# Altium footprint library ref-packages.PCBLIB: 1543 footprints (part 81 of 103)
Each footprint in its own frame and in the unit in brackets; x right, y up, seen from the top. Pads: shape width x height; smd on the part's side, far side on the other; paste and mask are expansions set on the pad; w line width, h text height; cw(c..) or ccw(c..) is an arc to the next point about the centre after c.
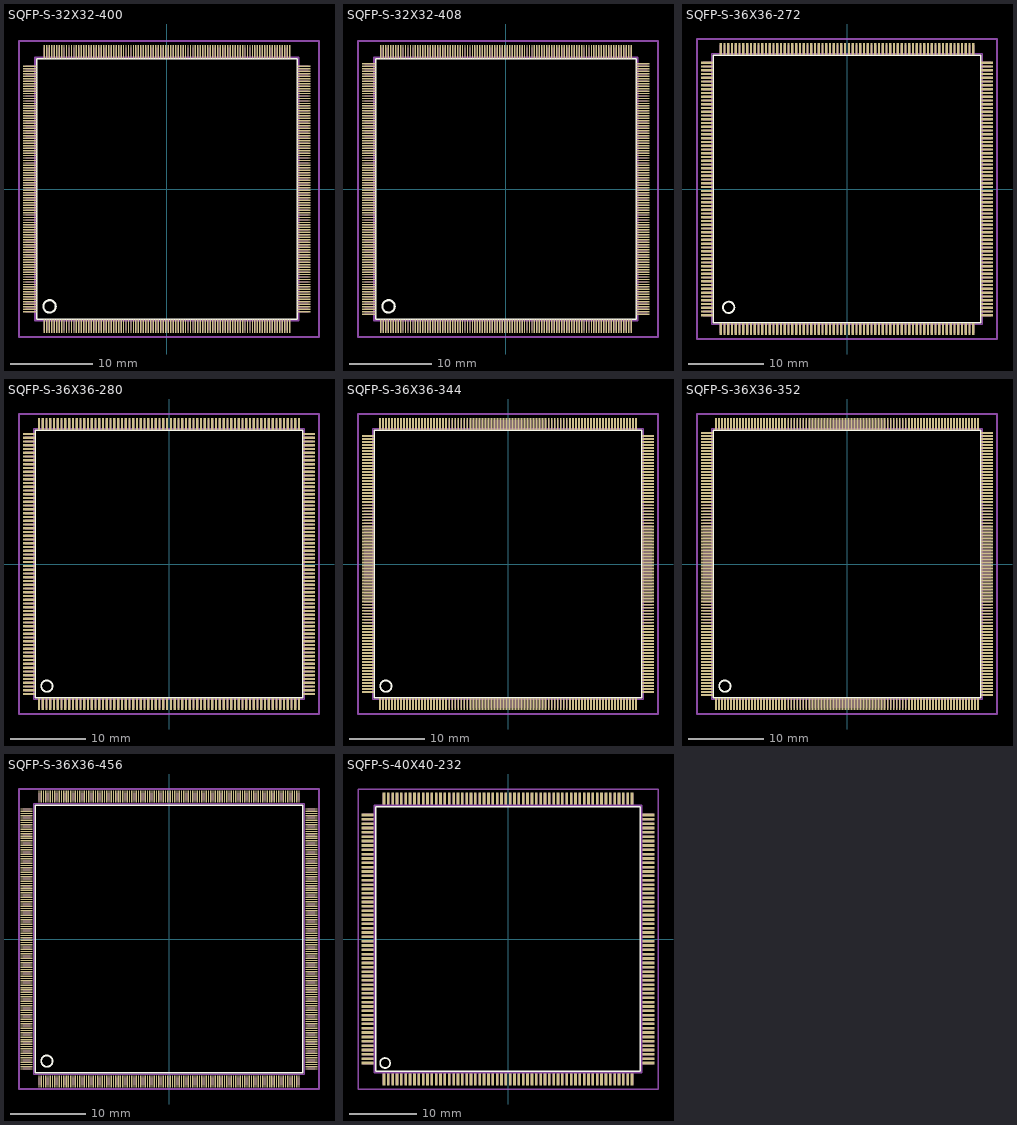
[diagram p80: the footprints below, top view; thin cyan lines are the x and y axes]

## SQFP-S-32X32-400 [mm]
pads (400):
  rect 0.17x1.6 smd: 1(-14.85,-16.6) 2(-14.55,-16.6) 3(-14.25,-16.6) 4(-13.95,-16.6) 5(-13.65,-16.6) 6(-13.35,-16.6) 7(-13.05,-16.6) 8(-12.75,-16.6) 9(-12.45,-16.6) 10(-12.15,-16.6) 11(-11.85,-16.6) 12(-11.55,-16.6) 13(-11.25,-16.6) 14(-10.95,-16.6) 15(-10.65,-16.6) 16(-10.35,-16.6) 17(-10.05,-16.6) 18(-9.75,-16.6) 19(-9.45,-16.6) 20(-9.15,-16.6) 21(-8.85,-16.6) 22(-8.55,-16.6) 23(-8.25,-16.6) 24(-7.95,-16.6) 25(-7.65,-16.6) 26(-7.35,-16.6) 27(-7.05,-16.6) 28(-6.75,-16.6) 29(-6.45,-16.6) 30(-6.15,-16.6) 31(-5.85,-16.6) 32(-5.55,-16.6) 33(-5.25,-16.6) 34(-4.95,-16.6) 35(-4.65,-16.6) 36(-4.35,-16.6) 37(-4.05,-16.6) 38(-3.75,-16.6) 39(-3.45,-16.6) 40(-3.15,-16.6) 41(-2.85,-16.6) 42(-2.55,-16.6) 43(-2.25,-16.6) 44(-1.95,-16.6) 45(-1.65,-16.6) 46(-1.35,-16.6) 47(-1.05,-16.6) 48(-0.75,-16.6) 49(-0.45,-16.6) 50(-0.15,-16.6) 51(0.15,-16.6) 52(0.45,-16.6) 53(0.75,-16.6) 54(1.05,-16.6) 55(1.35,-16.6) 56(1.65,-16.6) 57(1.95,-16.6) 58(2.25,-16.6) 59(2.55,-16.6) 60(2.85,-16.6) 61(3.15,-16.6) 62(3.45,-16.6) 63(3.75,-16.6) 64(4.05,-16.6) 65(4.35,-16.6) 66(4.65,-16.6) 67(4.95,-16.6) 68(5.25,-16.6) 69(5.55,-16.6) 70(5.85,-16.6) 71(6.15,-16.6) 72(6.45,-16.6) 73(6.75,-16.6) 74(7.05,-16.6) 75(7.35,-16.6) 76(7.65,-16.6) 77(7.95,-16.6) 78(8.25,-16.6) 79(8.55,-16.6) 80(8.85,-16.6) 81(9.15,-16.6) 82(9.45,-16.6) 83(9.75,-16.6) 84(10.05,-16.6) 85(10.35,-16.6) 86(10.65,-16.6) 87(10.95,-16.6) 88(11.25,-16.6) 89(11.55,-16.6) 90(11.85,-16.6) 91(12.15,-16.6) 92(12.45,-16.6) 93(12.75,-16.6) 94(13.05,-16.6) 95(13.35,-16.6) 96(13.65,-16.6) 97(13.95,-16.6) 98(14.25,-16.6) 99(14.55,-16.6) 100(14.85,-16.6) 201(14.85,16.6) 202(14.55,16.6) 203(14.25,16.6) 204(13.95,16.6) 205(13.65,16.6) 206(13.35,16.6) 207(13.05,16.6) 208(12.75,16.6) 209(12.45,16.6) 210(12.15,16.6) 211(11.85,16.6) 212(11.55,16.6) 213(11.25,16.6) 214(10.95,16.6) 215(10.65,16.6) 216(10.35,16.6) 217(10.05,16.6) 218(9.75,16.6) 219(9.45,16.6) 220(9.15,16.6) 221(8.85,16.6) 222(8.55,16.6) 223(8.25,16.6) 224(7.95,16.6) 225(7.65,16.6) 226(7.35,16.6) 227(7.05,16.6) 228(6.75,16.6) 229(6.45,16.6) 230(6.15,16.6) 231(5.85,16.6) 232(5.55,16.6) 233(5.25,16.6) 234(4.95,16.6) 235(4.65,16.6) 236(4.35,16.6) 237(4.05,16.6) 238(3.75,16.6) 239(3.45,16.6) 240(3.15,16.6) 241(2.85,16.6) 242(2.55,16.6) 243(2.25,16.6) 244(1.95,16.6) 245(1.65,16.6) 246(1.35,16.6) 247(1.05,16.6) 248(0.75,16.6) 249(0.45,16.6) 250(0.15,16.6) 251(-0.15,16.6) 252(-0.45,16.6) 253(-0.75,16.6) 254(-1.05,16.6) 255(-1.35,16.6) 256(-1.65,16.6) 257(-1.95,16.6) 258(-2.25,16.6) 259(-2.55,16.6) 260(-2.85,16.6) 261(-3.15,16.6) 262(-3.45,16.6) 263(-3.75,16.6) 264(-4.05,16.6) 265(-4.35,16.6) 266(-4.65,16.6) 267(-4.95,16.6) 268(-5.25,16.6) 269(-5.55,16.6) 270(-5.85,16.6) 271(-6.15,16.6) 272(-6.45,16.6) 273(-6.75,16.6) 274(-7.05,16.6) 275(-7.35,16.6) 276(-7.65,16.6) 277(-7.95,16.6) 278(-8.25,16.6) 279(-8.55,16.6) 280(-8.85,16.6) 281(-9.15,16.6) 282(-9.45,16.6) 283(-9.75,16.6) 284(-10.05,16.6) 285(-10.35,16.6) 286(-10.65,16.6) 287(-10.95,16.6) 288(-11.25,16.6) 289(-11.55,16.6) 290(-11.85,16.6) 291(-12.15,16.6) 292(-12.45,16.6) 293(-12.75,16.6) 294(-13.05,16.6) 295(-13.35,16.6) 296(-13.65,16.6) 297(-13.95,16.6) 298(-14.25,16.6) 299(-14.55,16.6) 300(-14.85,16.6)
  rect 1.6x0.17 smd: 101(16.6,-14.85) 102(16.6,-14.55) 103(16.6,-14.25) 104(16.6,-13.95) 105(16.6,-13.65) 106(16.6,-13.35) 107(16.6,-13.05) 108(16.6,-12.75) 109(16.6,-12.45) 110(16.6,-12.15) 111(16.6,-11.85) 112(16.6,-11.55) 113(16.6,-11.25) 114(16.6,-10.95) 115(16.6,-10.65) 116(16.6,-10.35) 117(16.6,-10.05) 118(16.6,-9.75) 119(16.6,-9.45) 120(16.6,-9.15) 121(16.6,-8.85) 122(16.6,-8.55) 123(16.6,-8.25) 124(16.6,-7.95) 125(16.6,-7.65) 126(16.6,-7.35) 127(16.6,-7.05) 128(16.6,-6.75) 129(16.6,-6.45) 130(16.6,-6.15) 131(16.6,-5.85) 132(16.6,-5.55) 133(16.6,-5.25) 134(16.6,-4.95) 135(16.6,-4.65) 136(16.6,-4.35) 137(16.6,-4.05) 138(16.6,-3.75) 139(16.6,-3.45) 140(16.6,-3.15) 141(16.6,-2.85) 142(16.6,-2.55) 143(16.6,-2.25) 144(16.6,-1.95) 145(16.6,-1.65) 146(16.6,-1.35) 147(16.6,-1.05) 148(16.6,-0.75) 149(16.6,-0.45) 150(16.6,-0.15) 151(16.6,0.15) 152(16.6,0.45) 153(16.6,0.75) 154(16.6,1.05) 155(16.6,1.35) 156(16.6,1.65) 157(16.6,1.95) 158(16.6,2.25) 159(16.6,2.55) 160(16.6,2.85) 161(16.6,3.15) 162(16.6,3.45) 163(16.6,3.75) 164(16.6,4.05) 165(16.6,4.35) 166(16.6,4.65) 167(16.6,4.95) 168(16.6,5.25) 169(16.6,5.55) 170(16.6,5.85) 171(16.6,6.15) 172(16.6,6.45) 173(16.6,6.75) 174(16.6,7.05) 175(16.6,7.35) 176(16.6,7.65) 177(16.6,7.95) 178(16.6,8.25) 179(16.6,8.55) 180(16.6,8.85) 181(16.6,9.15) 182(16.6,9.45) 183(16.6,9.75) 184(16.6,10.05) 185(16.6,10.35) 186(16.6,10.65) 187(16.6,10.95) 188(16.6,11.25) 189(16.6,11.55) 190(16.6,11.85) 191(16.6,12.15) 192(16.6,12.45) 193(16.6,12.75) 194(16.6,13.05) 195(16.6,13.35) 196(16.6,13.65) 197(16.6,13.95) 198(16.6,14.25) 199(16.6,14.55) 200(16.6,14.85) 301(-16.6,14.85) 302(-16.6,14.55) 303(-16.6,14.25) 304(-16.6,13.95) 305(-16.6,13.65) 306(-16.6,13.35) 307(-16.6,13.05) 308(-16.6,12.75) 309(-16.6,12.45) 310(-16.6,12.15) 311(-16.6,11.85) 312(-16.6,11.55) 313(-16.6,11.25) 314(-16.6,10.95) 315(-16.6,10.65) 316(-16.6,10.35) 317(-16.6,10.05) 318(-16.6,9.75) 319(-16.6,9.45) 320(-16.6,9.15) 321(-16.6,8.85) 322(-16.6,8.55) 323(-16.6,8.25) 324(-16.6,7.95) 325(-16.6,7.65) 326(-16.6,7.35) 327(-16.6,7.05) 328(-16.6,6.75) 329(-16.6,6.45) 330(-16.6,6.15) 331(-16.6,5.85) 332(-16.6,5.55) 333(-16.6,5.25) 334(-16.6,4.95) 335(-16.6,4.65) 336(-16.6,4.35) 337(-16.6,4.05) 338(-16.6,3.75) 339(-16.6,3.45) 340(-16.6,3.15) 341(-16.6,2.85) 342(-16.6,2.55) 343(-16.6,2.25) 344(-16.6,1.95) 345(-16.6,1.65) 346(-16.6,1.35) 347(-16.6,1.05) 348(-16.6,0.75) 349(-16.6,0.45) 350(-16.6,0.15) 351(-16.6,-0.15) 352(-16.6,-0.45) 353(-16.6,-0.75) 354(-16.6,-1.05) 355(-16.6,-1.35) 356(-16.6,-1.65) 357(-16.6,-1.95) 358(-16.6,-2.25) 359(-16.6,-2.55) 360(-16.6,-2.85) 361(-16.6,-3.15) 362(-16.6,-3.45) 363(-16.6,-3.75) 364(-16.6,-4.05) 365(-16.6,-4.35) 366(-16.6,-4.65) 367(-16.6,-4.95) 368(-16.6,-5.25) 369(-16.6,-5.55) 370(-16.6,-5.85) 371(-16.6,-6.15) 372(-16.6,-6.45) 373(-16.6,-6.75) 374(-16.6,-7.05) 375(-16.6,-7.35) 376(-16.6,-7.65) 377(-16.6,-7.95) 378(-16.6,-8.25) 379(-16.6,-8.55) 380(-16.6,-8.85) 381(-16.6,-9.15) 382(-16.6,-9.45) 383(-16.6,-9.75) 384(-16.6,-10.05) 385(-16.6,-10.35) 386(-16.6,-10.65) 387(-16.6,-10.95) 388(-16.6,-11.25) 389(-16.6,-11.55) 390(-16.6,-11.85) 391(-16.6,-12.15) 392(-16.6,-12.45) 393(-16.6,-12.75) 394(-16.6,-13.05) 395(-16.6,-13.35) 396(-16.6,-13.65) 397(-16.6,-13.95) 398(-16.6,-14.25) 399(-16.6,-14.55) 400(-16.6,-14.85)
Top Overlay:
  circle w0.254: c-14.2,-14.2 r0.75
  lines w0.203: -15.77,-15.76 15.76,-15.76 15.76,15.76 -15.77,15.76 -15.77,-15.76
Mechanical 16:
  drawing of 404 lines, arcs and shapes, not listed
Mechanical 27:
  lines w0.2: -17.9,-17.9 -17.9,17.9 18.4,17.9 18.4,-17.9 -17.9,-17.9

## SQFP-S-32X32-408 [mm]
pads (408):
  rect 0.17x1.6 smd: 1(-15.15,-16.6) 2(-14.85,-16.6) 3(-14.55,-16.6) 4(-14.25,-16.6) 5(-13.95,-16.6) 6(-13.65,-16.6) 7(-13.35,-16.6) 8(-13.05,-16.6) 9(-12.75,-16.6) 10(-12.45,-16.6) 11(-12.15,-16.6) 12(-11.85,-16.6) 13(-11.55,-16.6) 14(-11.25,-16.6) 15(-10.95,-16.6) 16(-10.65,-16.6) 17(-10.35,-16.6) 18(-10.05,-16.6) 19(-9.75,-16.6) 20(-9.45,-16.6) 21(-9.15,-16.6) 22(-8.85,-16.6) 23(-8.55,-16.6) 24(-8.25,-16.6) 25(-7.95,-16.6) 26(-7.65,-16.6) 27(-7.35,-16.6) 28(-7.05,-16.6) 29(-6.75,-16.6) 30(-6.45,-16.6) 31(-6.15,-16.6) 32(-5.85,-16.6) 33(-5.55,-16.6) 34(-5.25,-16.6) 35(-4.95,-16.6) 36(-4.65,-16.6) 37(-4.35,-16.6) 38(-4.05,-16.6) 39(-3.75,-16.6) 40(-3.45,-16.6) 41(-3.15,-16.6) 42(-2.85,-16.6) 43(-2.55,-16.6) 44(-2.25,-16.6) 45(-1.95,-16.6) 46(-1.65,-16.6) 47(-1.35,-16.6) 48(-1.05,-16.6) 49(-0.75,-16.6) 50(-0.45,-16.6) 51(-0.15,-16.6) 52(0.15,-16.6) 53(0.45,-16.6) 54(0.75,-16.6) 55(1.05,-16.6) 56(1.35,-16.6) 57(1.65,-16.6) 58(1.95,-16.6) 59(2.25,-16.6) 60(2.55,-16.6) 61(2.85,-16.6) 62(3.15,-16.6) 63(3.45,-16.6) 64(3.75,-16.6) 65(4.05,-16.6) 66(4.35,-16.6) 67(4.65,-16.6) 68(4.95,-16.6) 69(5.25,-16.6) 70(5.55,-16.6) 71(5.85,-16.6) 72(6.15,-16.6) 73(6.45,-16.6) 74(6.75,-16.6) 75(7.05,-16.6) 76(7.35,-16.6) 77(7.65,-16.6) 78(7.95,-16.6) 79(8.25,-16.6) 80(8.55,-16.6) 81(8.85,-16.6) 82(9.15,-16.6) 83(9.45,-16.6) 84(9.75,-16.6) 85(10.05,-16.6) 86(10.35,-16.6) 87(10.65,-16.6) 88(10.95,-16.6) 89(11.25,-16.6) 90(11.55,-16.6) 91(11.85,-16.6) 92(12.15,-16.6) 93(12.45,-16.6) 94(12.75,-16.6) 95(13.05,-16.6) 96(13.35,-16.6) 97(13.65,-16.6) 98(13.95,-16.6) 99(14.25,-16.6) 100(14.55,-16.6) 101(14.85,-16.6) 102(15.15,-16.6) 205(15.15,16.6) 206(14.85,16.6) 207(14.55,16.6) 208(14.25,16.6) 209(13.95,16.6) 210(13.65,16.6) 211(13.35,16.6) 212(13.05,16.6) 213(12.75,16.6) 214(12.45,16.6) 215(12.15,16.6) 216(11.85,16.6) 217(11.55,16.6) 218(11.25,16.6) 219(10.95,16.6) 220(10.65,16.6) 221(10.35,16.6) 222(10.05,16.6) 223(9.75,16.6) 224(9.45,16.6) 225(9.15,16.6) 226(8.85,16.6) 227(8.55,16.6) 228(8.25,16.6) 229(7.95,16.6) 230(7.65,16.6) 231(7.35,16.6) 232(7.05,16.6) 233(6.75,16.6) 234(6.45,16.6) 235(6.15,16.6) 236(5.85,16.6) 237(5.55,16.6) 238(5.25,16.6) 239(4.95,16.6) 240(4.65,16.6) 241(4.35,16.6) 242(4.05,16.6) 243(3.75,16.6) 244(3.45,16.6) 245(3.15,16.6) 246(2.85,16.6) 247(2.55,16.6) 248(2.25,16.6) 249(1.95,16.6) 250(1.65,16.6) 251(1.35,16.6) 252(1.05,16.6) 253(0.75,16.6) 254(0.45,16.6) 255(0.15,16.6) 256(-0.15,16.6) 257(-0.45,16.6) 258(-0.75,16.6) 259(-1.05,16.6) 260(-1.35,16.6) 261(-1.65,16.6) 262(-1.95,16.6) 263(-2.25,16.6) 264(-2.55,16.6) 265(-2.85,16.6) 266(-3.15,16.6) 267(-3.45,16.6) 268(-3.75,16.6) 269(-4.05,16.6) 270(-4.35,16.6) 271(-4.65,16.6) 272(-4.95,16.6) 273(-5.25,16.6) 274(-5.55,16.6) 275(-5.85,16.6) 276(-6.15,16.6) 277(-6.45,16.6) 278(-6.75,16.6) 279(-7.05,16.6) 280(-7.35,16.6) 281(-7.65,16.6) 282(-7.95,16.6) 283(-8.25,16.6) 284(-8.55,16.6) 285(-8.85,16.6) 286(-9.15,16.6) 287(-9.45,16.6) 288(-9.75,16.6) 289(-10.05,16.6) 290(-10.35,16.6) 291(-10.65,16.6) 292(-10.95,16.6) 293(-11.25,16.6) 294(-11.55,16.6) 295(-11.85,16.6) 296(-12.15,16.6) 297(-12.45,16.6) 298(-12.75,16.6) 299(-13.05,16.6) 300(-13.35,16.6) 301(-13.65,16.6) 302(-13.95,16.6) 303(-14.25,16.6) 304(-14.55,16.6) 305(-14.85,16.6) 306(-15.15,16.6)
  rect 1.6x0.17 smd: 103(16.6,-15.15) 104(16.6,-14.85) 105(16.6,-14.55) 106(16.6,-14.25) 107(16.6,-13.95) 108(16.6,-13.65) 109(16.6,-13.35) 110(16.6,-13.05) 111(16.6,-12.75) 112(16.6,-12.45) 113(16.6,-12.15) 114(16.6,-11.85) 115(16.6,-11.55) 116(16.6,-11.25) 117(16.6,-10.95) 118(16.6,-10.65) 119(16.6,-10.35) 120(16.6,-10.05) 121(16.6,-9.75) 122(16.6,-9.45) 123(16.6,-9.15) 124(16.6,-8.85) 125(16.6,-8.55) 126(16.6,-8.25) 127(16.6,-7.95) 128(16.6,-7.65) 129(16.6,-7.35) 130(16.6,-7.05) 131(16.6,-6.75) 132(16.6,-6.45) 133(16.6,-6.15) 134(16.6,-5.85) 135(16.6,-5.55) 136(16.6,-5.25) 137(16.6,-4.95) 138(16.6,-4.65) 139(16.6,-4.35) 140(16.6,-4.05) 141(16.6,-3.75) 142(16.6,-3.45) 143(16.6,-3.15) 144(16.6,-2.85) 145(16.6,-2.55) 146(16.6,-2.25) 147(16.6,-1.95) 148(16.6,-1.65) 149(16.6,-1.35) 150(16.6,-1.05) 151(16.6,-0.75) 152(16.6,-0.45) 153(16.6,-0.15) 154(16.6,0.15) 155(16.6,0.45) 156(16.6,0.75) 157(16.6,1.05) 158(16.6,1.35) 159(16.6,1.65) 160(16.6,1.95) 161(16.6,2.25) 162(16.6,2.55) 163(16.6,2.85) 164(16.6,3.15) 165(16.6,3.45) 166(16.6,3.75) 167(16.6,4.05) 168(16.6,4.35) 169(16.6,4.65) 170(16.6,4.95) 171(16.6,5.25) 172(16.6,5.55) 173(16.6,5.85) 174(16.6,6.15) 175(16.6,6.45) 176(16.6,6.75) 177(16.6,7.05) 178(16.6,7.35) 179(16.6,7.65) 180(16.6,7.95) 181(16.6,8.25) 182(16.6,8.55) 183(16.6,8.85) 184(16.6,9.15) 185(16.6,9.45) 186(16.6,9.75) 187(16.6,10.05) 188(16.6,10.35) 189(16.6,10.65) 190(16.6,10.95) 191(16.6,11.25) 192(16.6,11.55) 193(16.6,11.85) 194(16.6,12.15) 195(16.6,12.45) 196(16.6,12.75) 197(16.6,13.05) 198(16.6,13.35) 199(16.6,13.65) 200(16.6,13.95) 201(16.6,14.25) 202(16.6,14.55) 203(16.6,14.85) 204(16.6,15.15) 307(-16.6,15.15) 308(-16.6,14.85) 309(-16.6,14.55) 310(-16.6,14.25) 311(-16.6,13.95) 312(-16.6,13.65) 313(-16.6,13.35) 314(-16.6,13.05) 315(-16.6,12.75) 316(-16.6,12.45) 317(-16.6,12.15) 318(-16.6,11.85) 319(-16.6,11.55) 320(-16.6,11.25) 321(-16.6,10.95) 322(-16.6,10.65) 323(-16.6,10.35) 324(-16.6,10.05) 325(-16.6,9.75) 326(-16.6,9.45) 327(-16.6,9.15) 328(-16.6,8.85) 329(-16.6,8.55) 330(-16.6,8.25) 331(-16.6,7.95) 332(-16.6,7.65) 333(-16.6,7.35) 334(-16.6,7.05) 335(-16.6,6.75) 336(-16.6,6.45) 337(-16.6,6.15) 338(-16.6,5.85) 339(-16.6,5.55) 340(-16.6,5.25) 341(-16.6,4.95) 342(-16.6,4.65) 343(-16.6,4.35) 344(-16.6,4.05) 345(-16.6,3.75) 346(-16.6,3.45) 347(-16.6,3.15) 348(-16.6,2.85) 349(-16.6,2.55) 350(-16.6,2.25) 351(-16.6,1.95) 352(-16.6,1.65) 353(-16.6,1.35) 354(-16.6,1.05) 355(-16.6,0.75) 356(-16.6,0.45) 357(-16.6,0.15) 358(-16.6,-0.15) 359(-16.6,-0.45) 360(-16.6,-0.75) 361(-16.6,-1.05) 362(-16.6,-1.35) 363(-16.6,-1.65) 364(-16.6,-1.95) 365(-16.6,-2.25) 366(-16.6,-2.55) 367(-16.6,-2.85) 368(-16.6,-3.15) 369(-16.6,-3.45) 370(-16.6,-3.75) 371(-16.6,-4.05) 372(-16.6,-4.35) 373(-16.6,-4.65) 374(-16.6,-4.95) 375(-16.6,-5.25) 376(-16.6,-5.55) 377(-16.6,-5.85) 378(-16.6,-6.15) 379(-16.6,-6.45) 380(-16.6,-6.75) 381(-16.6,-7.05) 382(-16.6,-7.35) 383(-16.6,-7.65) 384(-16.6,-7.95) 385(-16.6,-8.25) 386(-16.6,-8.55) 387(-16.6,-8.85) 388(-16.6,-9.15) 389(-16.6,-9.45) 390(-16.6,-9.75) 391(-16.6,-10.05) 392(-16.6,-10.35) 393(-16.6,-10.65) 394(-16.6,-10.95) 395(-16.6,-11.25) 396(-16.6,-11.55) 397(-16.6,-11.85) 398(-16.6,-12.15) 399(-16.6,-12.45) 400(-16.6,-12.75) 401(-16.6,-13.05) 402(-16.6,-13.35) 403(-16.6,-13.65) 404(-16.6,-13.95) 405(-16.6,-14.25) 406(-16.6,-14.55) 407(-16.6,-14.85) 408(-16.6,-15.15)
Top Overlay:
  circle w0.254: c-14.2,-14.2 r0.75
  lines w0.203: -15.77,-15.76 15.76,-15.76 15.76,15.76 -15.77,15.76 -15.77,-15.76
Mechanical 16:
  drawing of 412 lines, arcs and shapes, not listed
Mechanical 27:
  lines w0.2: -17.9,-17.9 -17.9,17.9 18.4,17.9 18.4,-17.9 -17.9,-17.9

## SQFP-S-36X36-272 [mil]
pads (272):
  rect 11.81x62.99 smd: 1(-659.45,-732.28) 2(-639.76,-732.28) 3(-620.08,-732.28) 4(-600.39,-732.28) 5(-580.71,-732.28) 6(-561.02,-732.28) 7(-541.34,-732.28) 8(-521.65,-732.28) 9(-501.97,-732.28) 10(-482.28,-732.28) 11(-462.6,-732.28) 12(-442.91,-732.28) 13(-423.23,-732.28) 14(-403.54,-732.28) 15(-383.86,-732.28) 16(-364.17,-732.28) 17(-344.49,-732.28) 18(-324.8,-732.28) 19(-305.12,-732.28) 20(-285.43,-732.28) 21(-265.75,-732.28) 22(-246.06,-732.28) 23(-226.38,-732.28) 24(-206.69,-732.28) 25(-187.01,-732.28) 26(-167.32,-732.28) 27(-147.64,-732.28) 28(-127.95,-732.28) 29(-108.27,-732.28) 30(-88.58,-732.28) 31(-68.9,-732.28) 32(-49.21,-732.28) 33(-29.53,-732.28) 34(-9.84,-732.28) 35(9.84,-732.28) 36(29.53,-732.28) 37(49.21,-732.28) 38(68.9,-732.28) 39(88.58,-732.28) 40(108.27,-732.28) 41(127.95,-732.28) 42(147.64,-732.28) 43(167.32,-732.28) 44(187.01,-732.28) 45(206.69,-732.28) 46(226.38,-732.28) 47(246.06,-732.28) 48(265.75,-732.28) 49(285.43,-732.28) 50(305.12,-732.28) 51(324.8,-732.28) 52(344.49,-732.28) 53(364.17,-732.28) 54(383.86,-732.28) 55(403.54,-732.28) 56(423.23,-732.28) 57(442.91,-732.28) 58(462.6,-732.28) 59(482.28,-732.28) 60(501.97,-732.28) 61(521.65,-732.28) 62(541.34,-732.28) 63(561.02,-732.28) 64(580.71,-732.28) 65(600.39,-732.28) 66(620.08,-732.28) 67(639.76,-732.28) 68(659.45,-732.28) 137(659.45,732.28) 138(639.76,732.28) 139(620.08,732.28) 140(600.39,732.28) 141(580.71,732.28) 142(561.02,732.28) 143(541.34,732.28) 144(521.65,732.28) 145(501.97,732.28) 146(482.28,732.28) 147(462.6,732.28) 148(442.91,732.28) 149(423.23,732.28) 150(403.54,732.28) 151(383.86,732.28) 152(364.17,732.28) 153(344.49,732.28) 154(324.8,732.28) 155(305.12,732.28) 156(285.43,732.28) 157(265.75,732.28) 158(246.06,732.28) 159(226.38,732.28) 160(206.69,732.28) 161(187.01,732.28) 162(167.32,732.28) 163(147.64,732.28) 164(127.95,732.28) 165(108.27,732.28) 166(88.58,732.28) 167(68.9,732.28) 168(49.21,732.28) 169(29.53,732.28) 170(9.84,732.28) 171(-9.84,732.28) 172(-29.53,732.28) 173(-49.21,732.28) 174(-68.9,732.28) 175(-88.58,732.28) 176(-108.27,732.28) 177(-127.95,732.28) 178(-147.64,732.28) 179(-167.32,732.28) 180(-187.01,732.28) 181(-206.69,732.28) 182(-226.38,732.28) 183(-246.06,732.28) 184(-265.75,732.28) 185(-285.43,732.28) 186(-305.12,732.28) 187(-324.8,732.28) 188(-344.49,732.28) 189(-364.17,732.28) 190(-383.86,732.28) 191(-403.54,732.28) 192(-423.23,732.28) 193(-442.91,732.28) 194(-462.6,732.28) 195(-482.28,732.28) 196(-501.97,732.28) 197(-521.65,732.28) 198(-541.34,732.28) 199(-561.02,732.28) 200(-580.71,732.28) 201(-600.39,732.28) 202(-620.08,732.28) 203(-639.76,732.28) 204(-659.45,732.28)
  rect 62.99x11.81 smd: 69(732.28,-659.45) 70(732.28,-639.76) 71(732.28,-620.08) 72(732.28,-600.39) 73(732.28,-580.71) 74(732.28,-561.02) 75(732.28,-541.34) 76(732.28,-521.65) 77(732.28,-501.97) 78(732.28,-482.28) 79(732.28,-462.6) 80(732.28,-442.91) 81(732.28,-423.23) 82(732.28,-403.54) 83(732.28,-383.86) 84(732.28,-364.17) 85(732.28,-344.49) 86(732.28,-324.8) 87(732.28,-305.12) 88(732.28,-285.43) 89(732.28,-265.75) 90(732.28,-246.06) 91(732.28,-226.38) 92(732.28,-206.69) 93(732.28,-187.01) 94(732.28,-167.32) 95(732.28,-147.64) 96(732.28,-127.95) 97(732.28,-108.27) 98(732.28,-88.58) 99(732.28,-68.9) 100(732.28,-49.21) 101(732.28,-29.53) 102(732.28,-9.84) 103(732.28,9.84) 104(732.28,29.53) 105(732.28,49.21) 106(732.28,68.9) 107(732.28,88.58) 108(732.28,108.27) 109(732.28,127.95) 110(732.28,147.64) 111(732.28,167.32) 112(732.28,187.01) 113(732.28,206.69) 114(732.28,226.38) 115(732.28,246.06) 116(732.28,265.75) 117(732.28,285.43) 118(732.28,305.12) 119(732.28,324.8) 120(732.28,344.49) 121(732.28,364.17) 122(732.28,383.86) 123(732.28,403.54) 124(732.28,423.23) 125(732.28,442.91) 126(732.28,462.6) 127(732.28,482.28) 128(732.28,501.97) 129(732.28,521.65) 130(732.28,541.34) 131(732.28,561.02) 132(732.28,580.71) 133(732.28,600.39) 134(732.28,620.08) 135(732.28,639.76) 136(732.28,659.45) 205(-732.28,659.45) 206(-732.28,639.76) 207(-732.28,620.08) 208(-732.28,600.39) 209(-732.28,580.71) 210(-732.28,561.02) 211(-732.28,541.34) 212(-732.28,521.65) 213(-732.28,501.97) 214(-732.28,482.28) 215(-732.28,462.6) 216(-732.28,442.91) 217(-732.28,423.23) 218(-732.28,403.54) 219(-732.28,383.86) 220(-732.28,364.17) 221(-732.28,344.49) 222(-732.28,324.8) 223(-732.28,305.12) 224(-732.28,285.43) 225(-732.28,265.75) 226(-732.28,246.06) 227(-732.28,226.38) 228(-732.28,206.69) 229(-732.28,187.01) 230(-732.28,167.32) 231(-732.28,147.64) 232(-732.28,127.95) 233(-732.28,108.27) 234(-732.28,88.58) 235(-732.28,68.9) 236(-732.28,49.21) 237(-732.28,29.53) 238(-732.28,9.84) 239(-732.28,-9.84) 240(-732.28,-29.53) 241(-732.28,-49.21) 242(-732.28,-68.9) 243(-732.28,-88.58) 244(-732.28,-108.27) 245(-732.28,-127.95) 246(-732.28,-147.64) 247(-732.28,-167.32) 248(-732.28,-187.01) 249(-732.28,-206.69) 250(-732.28,-226.38) 251(-732.28,-246.06) 252(-732.28,-265.75) 253(-732.28,-285.43) 254(-732.28,-305.12) 255(-732.28,-324.8) 256(-732.28,-344.49) 257(-732.28,-364.17) 258(-732.28,-383.86) 259(-732.28,-403.54) 260(-732.28,-423.23) 261(-732.28,-442.91) 262(-732.28,-462.6) 263(-732.28,-482.28) 264(-732.28,-501.97) 265(-732.28,-521.65) 266(-732.28,-541.34) 267(-732.28,-561.02) 268(-732.28,-580.71) 269(-732.28,-600.39) 270(-732.28,-620.08) 271(-732.28,-639.76) 272(-732.28,-659.45)
Top Overlay:
  circle w10: c-618.11,-618.11 r29.53
  lines w8: -699.61,-699.21 699.21,-699.21 699.21,699.21 -699.61,699.21 -699.61,-699.21
Mechanical 16:
  drawing of 276 lines, arcs and shapes, not listed
Mechanical 27:
  lines w7.87: -783.46,-783.46 -783.46,783.46 783.46,783.46 783.46,-783.46 -783.46,-783.46

## SQFP-S-36X36-280 [mil]
pads (280):
  rect 11.81x62.99 smd: 1(-679.13,-732.28) 2(-659.45,-732.28) 3(-639.76,-732.28) 4(-620.08,-732.28) 5(-600.39,-732.28) 6(-580.71,-732.28) 7(-561.02,-732.28) 8(-541.34,-732.28) 9(-521.65,-732.28) 10(-501.97,-732.28) 11(-482.28,-732.28) 12(-462.6,-732.28) 13(-442.91,-732.28) 14(-423.23,-732.28) 15(-403.54,-732.28) 16(-383.86,-732.28) 17(-364.17,-732.28) 18(-344.49,-732.28) 19(-324.8,-732.28) 20(-305.12,-732.28) 21(-285.43,-732.28) 22(-265.75,-732.28) 23(-246.06,-732.28) 24(-226.38,-732.28) 25(-206.69,-732.28) 26(-187.01,-732.28) 27(-167.32,-732.28) 28(-147.64,-732.28) 29(-127.95,-732.28) 30(-108.27,-732.28) 31(-88.58,-732.28) 32(-68.9,-732.28) 33(-49.21,-732.28) 34(-29.53,-732.28) 35(-9.84,-732.28) 36(9.84,-732.28) 37(29.53,-732.28) 38(49.21,-732.28) 39(68.9,-732.28) 40(88.58,-732.28) 41(108.27,-732.28) 42(127.95,-732.28) 43(147.64,-732.28) 44(167.32,-732.28) 45(187.01,-732.28) 46(206.69,-732.28) 47(226.38,-732.28) 48(246.06,-732.28) 49(265.75,-732.28) 50(285.43,-732.28) 51(305.12,-732.28) 52(324.8,-732.28) 53(344.49,-732.28) 54(364.17,-732.28) 55(383.86,-732.28) 56(403.54,-732.28) 57(423.23,-732.28) 58(442.91,-732.28) 59(462.6,-732.28) 60(482.28,-732.28) 61(501.97,-732.28) 62(521.65,-732.28) 63(541.34,-732.28) 64(561.02,-732.28) 65(580.71,-732.28) 66(600.39,-732.28) 67(620.08,-732.28) 68(639.76,-732.28) 69(659.45,-732.28) 70(679.13,-732.28) 141(679.13,732.28) 142(659.45,732.28) 143(639.76,732.28) 144(620.08,732.28) 145(600.39,732.28) 146(580.71,732.28) 147(561.02,732.28) 148(541.34,732.28) 149(521.65,732.28) 150(501.97,732.28) 151(482.28,732.28) 152(462.6,732.28) 153(442.91,732.28) 154(423.23,732.28) 155(403.54,732.28) 156(383.86,732.28) 157(364.17,732.28) 158(344.49,732.28) 159(324.8,732.28) 160(305.12,732.28) 161(285.43,732.28) 162(265.75,732.28) 163(246.06,732.28) 164(226.38,732.28) 165(206.69,732.28) 166(187.01,732.28) 167(167.32,732.28) 168(147.64,732.28) 169(127.95,732.28) 170(108.27,732.28) 171(88.58,732.28) 172(68.9,732.28) 173(49.21,732.28) 174(29.53,732.28) 175(9.84,732.28) 176(-9.84,732.28) 177(-29.53,732.28) 178(-49.21,732.28) 179(-68.9,732.28) 180(-88.58,732.28) 181(-108.27,732.28) 182(-127.95,732.28) 183(-147.64,732.28) 184(-167.32,732.28) 185(-187.01,732.28) 186(-206.69,732.28) 187(-226.38,732.28) 188(-246.06,732.28) 189(-265.75,732.28) 190(-285.43,732.28) 191(-305.12,732.28) 192(-324.8,732.28) 193(-344.49,732.28) 194(-364.17,732.28) 195(-383.86,732.28) 196(-403.54,732.28) 197(-423.23,732.28) 198(-442.91,732.28) 199(-462.6,732.28) 200(-482.28,732.28) 201(-501.97,732.28) 202(-521.65,732.28) 203(-541.34,732.28) 204(-561.02,732.28) 205(-580.71,732.28) 206(-600.39,732.28) 207(-620.08,732.28) 208(-639.76,732.28) 209(-659.45,732.28) 210(-679.13,732.28)
  rect 62.99x11.81 smd: 71(732.28,-679.13) 72(732.28,-659.45) 73(732.28,-639.76) 74(732.28,-620.08) 75(732.28,-600.39) 76(732.28,-580.71) 77(732.28,-561.02) 78(732.28,-541.34) 79(732.28,-521.65) 80(732.28,-501.97) 81(732.28,-482.28) 82(732.28,-462.6) 83(732.28,-442.91) 84(732.28,-423.23) 85(732.28,-403.54) 86(732.28,-383.86) 87(732.28,-364.17) 88(732.28,-344.49) 89(732.28,-324.8) 90(732.28,-305.12) 91(732.28,-285.43) 92(732.28,-265.75) 93(732.28,-246.06) 94(732.28,-226.38) 95(732.28,-206.69) 96(732.28,-187.01) 97(732.28,-167.32) 98(732.28,-147.64) 99(732.28,-127.95) 100(732.28,-108.27) 101(732.28,-88.58) 102(732.28,-68.9) 103(732.28,-49.21) 104(732.28,-29.53) 105(732.28,-9.84) 106(732.28,9.84) 107(732.28,29.53) 108(732.28,49.21) 109(732.28,68.9) 110(732.28,88.58) 111(732.28,108.27) 112(732.28,127.95) 113(732.28,147.64) 114(732.28,167.32) 115(732.28,187.01) 116(732.28,206.69) 117(732.28,226.38) 118(732.28,246.06) 119(732.28,265.75) 120(732.28,285.43) 121(732.28,305.12) 122(732.28,324.8) 123(732.28,344.49) 124(732.28,364.17) 125(732.28,383.86) 126(732.28,403.54) 127(732.28,423.23) 128(732.28,442.91) 129(732.28,462.6) 130(732.28,482.28) 131(732.28,501.97) 132(732.28,521.65) 133(732.28,541.34) 134(732.28,561.02) 135(732.28,580.71) 136(732.28,600.39) 137(732.28,620.08) 138(732.28,639.76) 139(732.28,659.45) 140(732.28,679.13) 211(-732.28,679.13) 212(-732.28,659.45) 213(-732.28,639.76) 214(-732.28,620.08) 215(-732.28,600.39) 216(-732.28,580.71) 217(-732.28,561.02) 218(-732.28,541.34) 219(-732.28,521.65) 220(-732.28,501.97) 221(-732.28,482.28) 222(-732.28,462.6) 223(-732.28,442.91) 224(-732.28,423.23) 225(-732.28,403.54) 226(-732.28,383.86) 227(-732.28,364.17) 228(-732.28,344.49) 229(-732.28,324.8) 230(-732.28,305.12) 231(-732.28,285.43) 232(-732.28,265.75) 233(-732.28,246.06) 234(-732.28,226.38) 235(-732.28,206.69) 236(-732.28,187.01) 237(-732.28,167.32) 238(-732.28,147.64) 239(-732.28,127.95) 240(-732.28,108.27) 241(-732.28,88.58) 242(-732.28,68.9) 243(-732.28,49.21) 244(-732.28,29.53) 245(-732.28,9.84) 246(-732.28,-9.84) 247(-732.28,-29.53) 248(-732.28,-49.21) 249(-732.28,-68.9) 250(-732.28,-88.58) 251(-732.28,-108.27) 252(-732.28,-127.95) 253(-732.28,-147.64) 254(-732.28,-167.32) 255(-732.28,-187.01) 256(-732.28,-206.69) 257(-732.28,-226.38) 258(-732.28,-246.06) 259(-732.28,-265.75) 260(-732.28,-285.43) 261(-732.28,-305.12) 262(-732.28,-324.8) 263(-732.28,-344.49) 264(-732.28,-364.17) 265(-732.28,-383.86) 266(-732.28,-403.54) 267(-732.28,-423.23) 268(-732.28,-442.91) 269(-732.28,-462.6) 270(-732.28,-482.28) 271(-732.28,-501.97) 272(-732.28,-521.65) 273(-732.28,-541.34) 274(-732.28,-561.02) 275(-732.28,-580.71) 276(-732.28,-600.39) 277(-732.28,-620.08) 278(-732.28,-639.76) 279(-732.28,-659.45) 280(-732.28,-679.13)